# Altium integrated library Altium_WCAP-FTX2 (rev22a).IntLib: 106 symbols (part 1 of 2)
Pins are listed as number, name and electrical type; pins without a type are passive.

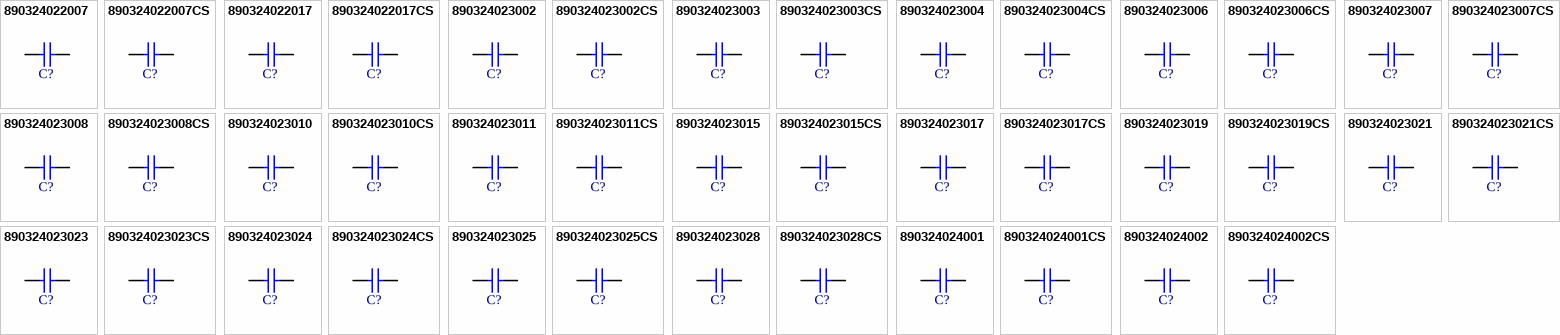
[diagram p0: symbols 890324022007 to 890324024002CS]

## 890324022007
designator C?, comment 15nF  (value not drawn)
WCAP-FTX2 Film Capacitor, THT, L11W6H10mm, 15nF, 275VAC; Manufacturer: Wurth Elektronik; Manufacturer Part Number: 890324022007; Capacitance Tolerance: +/-10%; Dissipation Factor @1kHz: 0.1%; Dissipation Factor @100kHz: 0.5%; Insulation Resistance: 30000MOhm; Pitch: 7.5mm; Rate of Voltage Rise: 500V/us; Rated Voltage (AC): 275V; Technical Reference: MX2P075153K275ASPB15000; ComponentLink1Description: Manufacturer Link; ComponentLink1URL: https://www.we-online.com/redexpert/article/890324022007?ad; ComponentLink2Description: Datasheet; ComponentLink2URL: https://www.we-online.com/redexpert/spec/890324022007?ad; Category: Film Capacitors; Match Code: WCAP-FTX2; Mount: Through Hole; Operating Temperature Max: 105°C; Operating Temperature Min: -40°C; Packaging: Carton; Length: 11mm; Width: 6mm; Height: 10mm; Capacitance: 15nF; Dissipation Factor @10kHz: 0.1%
footprint WCAP-FTX2_L11W6H10
pins: 1, 2

## 890324022007CS
designator C?, comment 15nF  (value not drawn)
WCAP-FTX2 Film Capacitor, THT, L11W6H10mm, 15nF, 275VAC; Manufacturer: Wurth Elektronik; Manufacturer Part Number: 890324022007CS; Capacitance Tolerance: +/-10%; Dissipation Factor @1kHz: 0.1%; Dissipation Factor @100kHz: 0.5%; Insulation Resistance: 30000MOhm; Pitch: 7.5mm; Rate of Voltage Rise: 500V/us; Rated Voltage (AC): 275V; Technical Reference: MX2P075153K275ACPP55004; ComponentLink1Description: Manufacturer Link; ComponentLink1URL: https://www.we-online.com/redexpert/article/890324022007CS?ad; ComponentLink2Description: Datasheet; ComponentLink2URL: https://www.we-online.com/redexpert/spec/890324022007CS?ad; Category: Film Capacitors; Match Code: WCAP-FTX2; Mount: Through Hole; Operating Temperature Max: 105°C; Operating Temperature Min: -40°C; Packaging: Carton; Length: 11mm; Width: 6mm; Height: 10mm; Capacitance: 15nF; Dissipation Factor @10kHz: 0.1%
footprint WCAP-FTX2_L11W6H10_CS
pins: 1, 2

## 890324022017
designator C?, comment 68nF  (value not drawn)
WCAP-FTX2 Film Capacitor, THT, L10W6H12mm, 68nF, 275VAC; Manufacturer: Wurth Elektronik; Manufacturer Part Number: 890324022017; Capacitance Tolerance: +/-10%; Dissipation Factor @1kHz: 0.1%; Dissipation Factor @100kHz: 0.5%; Insulation Resistance: 30000MOhm; Pitch: 7.5mm; Rate of Voltage Rise: 400V/us; Rated Voltage (AC): 275V; Technical Reference: MX2P075683K275ASPB15000; ComponentLink1Description: Manufacturer Link; ComponentLink1URL: https://www.we-online.com/redexpert/article/890324022017?ad; ComponentLink2Description: Datasheet; ComponentLink2URL: https://www.we-online.com/redexpert/spec/890324022017?ad; Category: Film Capacitors; Match Code: WCAP-FTX2; Mount: Through Hole; Operating Temperature Max: 105°C; Operating Temperature Min: -40°C; Packaging: Carton; Length: 10mm; Width: 6mm; Height: 12mm; Capacitance: 68nF; Dissipation Factor @10kHz: 0.1%
footprint WCAP-FTX2_L10W6H12
pins: 1, 2

## 890324022017CS
designator C?, comment 68nF  (value not drawn)
WCAP-FTX2 Film Capacitor, THT, L10W6H12mm, 68nF, 275VAC; Manufacturer: Wurth Elektronik; Manufacturer Part Number: 890324022017CS; Capacitance Tolerance: +/-10%; Dissipation Factor @1kHz: 0.1%; Dissipation Factor @100kHz: 0.5%; Insulation Resistance: 30000MOhm; Pitch: 7.5mm; Rate of Voltage Rise: 400V/us; Rated Voltage (AC): 275V; Technical Reference: MX2P075683K275ACPP45004; ComponentLink1Description: Manufacturer Link; ComponentLink1URL: https://www.we-online.com/redexpert/article/890324022017CS?ad; ComponentLink2Description: Datasheet; ComponentLink2URL: https://www.we-online.com/redexpert/spec/890324022017CS?ad; Category: Film Capacitors; Match Code: WCAP-FTX2; Mount: Through Hole; Operating Temperature Max: 105°C; Operating Temperature Min: -40°C; Packaging: Carton; Length: 10mm; Width: 6mm; Height: 12mm; Capacitance: 68nF; Dissipation Factor @10kHz: 0.1%
footprint WCAP-FTX2_L10W6H12_CS
pins: 1, 2

## 890324023002
designator C?, comment 5.6nF  (value not drawn)
WCAP-FTX2 Film Capacitor, THT, L13W5H10mm, 5.6nF, 275VAC; Manufacturer: Wurth Elektronik; Manufacturer Part Number: 890324023002; Capacitance Tolerance: +/-10%; Dissipation Factor @1kHz: 0.1%; Dissipation Factor @100kHz: 0.5%; Insulation Resistance: 30000MOhm; Pitch: 10mm; Rate of Voltage Rise: 600V/us; Rated Voltage (AC): 275V; Technical Reference: MX2P010562K275ASPB15000; ComponentLink1Description: Manufacturer Link; ComponentLink1URL: https://www.we-online.com/redexpert/article/890324023002?ad; ComponentLink2Description: Datasheet; ComponentLink2URL: https://www.we-online.com/redexpert/spec/890324023002?ad; Category: Film Capacitors; Match Code: WCAP-FTX2; Mount: Through Hole; Operating Temperature Max: 105°C; Operating Temperature Min: -40°C; Packaging: Carton; Length: 13mm; Width: 5mm; Height: 10mm; Capacitance: 5.6nF; Dissipation Factor @10kHz: 0.1%
footprint WCAP-FTX2_L13W5H10
pins: 1, 2

## 890324023002CS
designator C?, comment 5.6nF  (value not drawn)
WCAP-FTX2 Film Capacitor, THT, L13W5H10mm, 5.6nF, 275VAC; Manufacturer: Wurth Elektronik; Manufacturer Part Number: 890324023002CS; Capacitance Tolerance: +/-10%; Dissipation Factor @1kHz: 0.1%; Dissipation Factor @100kHz: 0.5%; Insulation Resistance: 30000MOhm; Pitch: 10mm; Rate of Voltage Rise: 600V/us; Rated Voltage (AC): 275V; Technical Reference: MX2P010562K275ACPP55004; ComponentLink1Description: Manufacturer Link; ComponentLink1URL: https://www.we-online.com/redexpert/article/890324023002CS?ad; ComponentLink2Description: Datasheet; ComponentLink2URL: https://www.we-online.com/redexpert/spec/890324023002CS?ad; Category: Film Capacitors; Match Code: WCAP-FTX2; Mount: Through Hole; Operating Temperature Max: 105°C; Operating Temperature Min: -40°C; Packaging: Carton; Length: 13mm; Width: 5mm; Height: 10mm; Capacitance: 5.6nF; Dissipation Factor @10kHz: 0.1%
footprint WCAP-FTX2_L13W5H10_CS
pins: 1, 2

## 890324023003
designator C?, comment 6.8nF  (value not drawn)
WCAP-FTX2 Film Capacitor, THT, L13W5H10mm, 6.8nF, 275VAC; Manufacturer: Wurth Elektronik; Manufacturer Part Number: 890324023003; Capacitance Tolerance: +/-10%; Dissipation Factor @1kHz: 0.1%; Dissipation Factor @100kHz: 0.5%; Insulation Resistance: 30000MOhm; Pitch: 10mm; Rate of Voltage Rise: 400V/us; Rated Voltage (AC): 275V; Technical Reference: MX2P010682K275ASPB15000; ComponentLink1Description: Manufacturer Link; ComponentLink1URL: https://www.we-online.com/redexpert/article/890324023003?ad; ComponentLink2Description: Datasheet; ComponentLink2URL: https://www.we-online.com/redexpert/spec/890324023003?ad; Category: Film Capacitors; Match Code: WCAP-FTX2; Mount: Through Hole; Operating Temperature Max: 105°C; Operating Temperature Min: -40°C; Packaging: Carton; Length: 13mm; Width: 5mm; Height: 10mm; Capacitance: 6.8nF; Dissipation Factor @10kHz: 0.1%
footprint WCAP-FTX2_L13W5H10
pins: 1, 2

## 890324023003CS
designator C?, comment 6.8nF  (value not drawn)
WCAP-FTX2 Film Capacitor, THT, L13W5H10mm, 6.8nF, 275VAC; Manufacturer: Wurth Elektronik; Manufacturer Part Number: 890324023003CS; Capacitance Tolerance: +/-10%; Dissipation Factor @1kHz: 0.1%; Dissipation Factor @100kHz: 0.5%; Insulation Resistance: 30000MOhm; Pitch: 10mm; Rate of Voltage Rise: 400V/us; Rated Voltage (AC): 275V; Technical Reference: MX2P010682K275ACPP55004; ComponentLink1Description: Manufacturer Link; ComponentLink1URL: https://www.we-online.com/redexpert/article/890324023003CS?ad; ComponentLink2Description: Datasheet; ComponentLink2URL: https://www.we-online.com/redexpert/spec/890324023003CS?ad; Category: Film Capacitors; Match Code: WCAP-FTX2; Mount: Through Hole; Operating Temperature Max: 105°C; Operating Temperature Min: -40°C; Packaging: Carton; Length: 13mm; Width: 5mm; Height: 10mm; Capacitance: 6.8nF; Dissipation Factor @10kHz: 0.1%
footprint WCAP-FTX2_L13W5H10_CS
pins: 1, 2

## 890324023004
designator C?, comment 8.2nF  (value not drawn)
WCAP-FTX2 Film Capacitor, THT, L13W5H10mm, 8.2nF, 275VAC; Manufacturer: Wurth Elektronik; Manufacturer Part Number: 890324023004; Capacitance Tolerance: +/-10%; Dissipation Factor @1kHz: 0.1%; Dissipation Factor @100kHz: 0.5%; Insulation Resistance: 30000MOhm; Pitch: 10mm; Rate of Voltage Rise: 400V/us; Rated Voltage (AC): 275V; Technical Reference: MX2P010822K275ASPB15000; ComponentLink1Description: Manufacturer Link; ComponentLink1URL: https://www.we-online.com/redexpert/article/890324023004?ad; ComponentLink2Description: Datasheet; ComponentLink2URL: https://www.we-online.com/redexpert/spec/890324023004?ad; Category: Film Capacitors; Match Code: WCAP-FTX2; Mount: Through Hole; Operating Temperature Max: 105°C; Operating Temperature Min: -40°C; Packaging: Carton; Length: 13mm; Width: 5mm; Height: 10mm; Capacitance: 8.2nF; Dissipation Factor @10kHz: 0.1%
footprint WCAP-FTX2_L13W5H10
pins: 1, 2

## 890324023004CS
designator C?, comment 8.2nF  (value not drawn)
WCAP-FTX2 Film Capacitor, THT, L13W5H10mm, 8.2nF, 275VAC; Manufacturer: Wurth Elektronik; Manufacturer Part Number: 890324023004CS; Capacitance Tolerance: +/-10%; Dissipation Factor @1kHz: 0.1%; Dissipation Factor @100kHz: 0.5%; Insulation Resistance: 30000MOhm; Pitch: 10mm; Rate of Voltage Rise: 400V/us; Rated Voltage (AC): 275V; Technical Reference: MX2P010822K275ACPP55004; ComponentLink1Description: Manufacturer Link; ComponentLink1URL: https://www.we-online.com/redexpert/article/890324023004CS?ad; ComponentLink2Description: Datasheet; ComponentLink2URL: https://www.we-online.com/redexpert/spec/890324023004CS?ad; Category: Film Capacitors; Match Code: WCAP-FTX2; Mount: Through Hole; Operating Temperature Max: 105°C; Operating Temperature Min: -40°C; Packaging: Carton; Length: 13mm; Width: 5mm; Height: 10mm; Capacitance: 8.2nF; Dissipation Factor @10kHz: 0.1%
footprint WCAP-FTX2_L13W5H10_CS
pins: 1, 2

## 890324023006
designator C?, comment 10nF  (value not drawn)
WCAP-FTX2 Film Capacitor, THT, L13W5H11mm, 10nF, 275VAC; Manufacturer: Wurth Elektronik; Manufacturer Part Number: 890324023006; Capacitance Tolerance: +/-10%; Dissipation Factor @1kHz: 0.1%; Dissipation Factor @100kHz: 0.5%; Insulation Resistance: 30000MOhm; Pitch: 10mm; Rate of Voltage Rise: 500V/us; Rated Voltage (AC): 275V; Technical Reference: MX2P010103K275ASPB16000; ComponentLink1Description: Manufacturer Link; ComponentLink1URL: https://www.we-online.com/redexpert/article/890324023006?ad; ComponentLink2Description: Datasheet; ComponentLink2URL: https://www.we-online.com/redexpert/spec/890324023006?ad; Category: Film Capacitors; Match Code: WCAP-FTX2; Mount: Through Hole; Operating Temperature Max: 105°C; Operating Temperature Min: -40°C; Packaging: Carton; Length: 13mm; Width: 5mm; Height: 11mm; Capacitance: 10nF; Dissipation Factor @10kHz: 0.1%
footprint WCAP-FTX2_L13W5H11
pins: 1, 2

## 890324023006CS
designator C?, comment 10nF  (value not drawn)
WCAP-FTX2 Film Capacitor, THT, L13W5H11mm, 10nF, 275VAC; Manufacturer: Wurth Elektronik; Manufacturer Part Number: 890324023006CS; Capacitance Tolerance: +/-10%; Dissipation Factor @1kHz: 0.1%; Dissipation Factor @100kHz: 0.5%; Insulation Resistance: 30000MOhm; Pitch: 10mm; Rate of Voltage Rise: 500V/us; Rated Voltage (AC): 275V; Technical Reference: MX2P010103K275ACPP56004; ComponentLink1Description: Manufacturer Link; ComponentLink1URL: https://www.we-online.com/redexpert/article/890324023006CS?ad; ComponentLink2Description: Datasheet; ComponentLink2URL: https://www.we-online.com/redexpert/spec/890324023006CS?ad; Category: Film Capacitors; Match Code: WCAP-FTX2; Mount: Through Hole; Operating Temperature Max: 105°C; Operating Temperature Min: -40°C; Packaging: Carton; Length: 13mm; Width: 5mm; Height: 11mm; Capacitance: 10nF; Dissipation Factor @10kHz: 0.1%
footprint WCAP-FTX2_L13W5H11_CS
pins: 1, 2

## 890324023007
designator C?, comment 12nF  (value not drawn)
WCAP-FTX2 Film Capacitor, THT, L13W5H11mm, 12nF, 275VAC; Manufacturer: Wurth Elektronik; Manufacturer Part Number: 890324023007; Capacitance Tolerance: +/-10%; Dissipation Factor @1kHz: 0.1%; Dissipation Factor @100kHz: 0.5%; Insulation Resistance: 30000MOhm; Pitch: 10mm; Rate of Voltage Rise: 300V/us; Rated Voltage (AC): 275V; Technical Reference: MX2P010123K275ASPB15000; ComponentLink1Description: Manufacturer Link; ComponentLink1URL: https://www.we-online.com/redexpert/article/890324023007?ad; ComponentLink2Description: Datasheet; ComponentLink2URL: https://www.we-online.com/redexpert/spec/890324023007?ad; Category: Film Capacitors; Match Code: WCAP-FTX2; Mount: Through Hole; Operating Temperature Max: 105°C; Operating Temperature Min: -40°C; Packaging: Carton; Length: 13mm; Width: 5mm; Height: 11mm; Capacitance: 12nF; Dissipation Factor @10kHz: 0.1%
footprint WCAP-FTX2_L13W5H11
pins: 1, 2

## 890324023007CS
designator C?, comment 12nF  (value not drawn)
WCAP-FTX2 Film Capacitor, THT, L13W5H11mm, 12nF, 275VAC; Manufacturer: Wurth Elektronik; Manufacturer Part Number: 890324023007CS; Capacitance Tolerance: +/-10%; Dissipation Factor @1kHz: 0.1%; Dissipation Factor @100kHz: 0.5%; Insulation Resistance: 30000MOhm; Pitch: 10mm; Rate of Voltage Rise: 300V/us; Rated Voltage (AC): 275V; Technical Reference: MX2P010123K275ACPP55004; ComponentLink1Description: Manufacturer Link; ComponentLink1URL: https://www.we-online.com/redexpert/article/890324023007CS?ad; ComponentLink2Description: Datasheet; ComponentLink2URL: https://www.we-online.com/redexpert/spec/890324023007CS?ad; Category: Film Capacitors; Match Code: WCAP-FTX2; Mount: Through Hole; Operating Temperature Max: 105°C; Operating Temperature Min: -40°C; Packaging: Carton; Length: 13mm; Width: 5mm; Height: 11mm; Capacitance: 12nF; Dissipation Factor @10kHz: 0.1%
footprint WCAP-FTX2_L13W5H11_CS
pins: 1, 2

## 890324023008
designator C?, comment 15nF  (value not drawn)
WCAP-FTX2 Film Capacitor, THT, L13W4.5H9.5mm, 15nF, 275VAC; Manufacturer: Wurth Elektronik; Manufacturer Part Number: 890324023008; Capacitance Tolerance: +/-10%; Dissipation Factor @1kHz: 0.1%; Dissipation Factor @100kHz: 0.5%; Insulation Resistance: 30000MOhm; Pitch: 10mm; Rate of Voltage Rise: 400V/us; Rated Voltage (AC): 275V; Technical Reference: MX2P010153K275ASPB15000; ComponentLink1Description: Manufacturer Link; ComponentLink1URL: https://www.we-online.com/redexpert/article/890324023008?ad; ComponentLink2Description: Datasheet; ComponentLink2URL: https://www.we-online.com/redexpert/spec/890324023008?ad; Category: Film Capacitors; Match Code: WCAP-FTX2; Mount: Through Hole; Operating Temperature Max: 105°C; Operating Temperature Min: -40°C; Packaging: Carton; Length: 13mm; Width: 4.5mm; Height: 9.5mm; Capacitance: 15nF; Dissipation Factor @10kHz: 0.1%
footprint WCAP-FTX2_L13W4.5H9.5
pins: 1, 2

## 890324023008CS
designator C?, comment 15nF  (value not drawn)
WCAP-FTX2 Film Capacitor, THT, L13W4.5H9.5mm, 15nF, 275VAC; Manufacturer: Wurth Elektronik; Manufacturer Part Number: 890324023008CS; Capacitance Tolerance: +/-10%; Dissipation Factor @1kHz: 0.1%; Dissipation Factor @100kHz: 0.5%; Insulation Resistance: 30000MOhm; Pitch: 10mm; Rate of Voltage Rise: 400V/us; Rated Voltage (AC): 275V; Technical Reference: MX2P010153K275ACPP55004; ComponentLink1Description: Manufacturer Link; ComponentLink1URL: https://www.we-online.com/redexpert/article/890324023008CS?ad; ComponentLink2Description: Datasheet; ComponentLink2URL: https://www.we-online.com/redexpert/spec/890324023008CS?ad; Category: Film Capacitors; Match Code: WCAP-FTX2; Mount: Through Hole; Operating Temperature Max: 105°C; Operating Temperature Min: -40°C; Packaging: Carton; Length: 13mm; Width: 4.5mm; Height: 9.5mm; Capacitance: 15nF; Dissipation Factor @10kHz: 0.1%
footprint WCAP-FTX2_L13W4.5H9.5_CS
pins: 1, 2

## 890324023010
designator C?, comment 18nF  (value not drawn)
WCAP-FTX2 Film Capacitor, THT, L13W5H11mm, 18nF, 275VAC; Manufacturer: Wurth Elektronik; Manufacturer Part Number: 890324023010; Capacitance Tolerance: +/-10%; Dissipation Factor @1kHz: 0.1%; Dissipation Factor @100kHz: 0.5%; Insulation Resistance: 30000MOhm; Pitch: 10mm; Rate of Voltage Rise: 400V/us; Rated Voltage (AC): 275V; Technical Reference: MX2P010183K275ASPB15000; ComponentLink1Description: Manufacturer Link; ComponentLink1URL: https://www.we-online.com/redexpert/article/890324023010?ad; ComponentLink2Description: Datasheet; ComponentLink2URL: https://www.we-online.com/redexpert/spec/890324023010?ad; Category: Film Capacitors; Match Code: WCAP-FTX2; Mount: Through Hole; Operating Temperature Max: 105°C; Operating Temperature Min: -40°C; Packaging: Carton; Length: 13mm; Width: 5mm; Height: 11mm; Capacitance: 18nF; Dissipation Factor @10kHz: 0.1%
footprint WCAP-FTX2_L13W5H11
pins: 1, 2

## 890324023010CS
designator C?, comment 18nF  (value not drawn)
WCAP-FTX2 Film Capacitor, THT, L13W5H11mm, 18nF, 275VAC; Manufacturer: Wurth Elektronik; Manufacturer Part Number: 890324023010CS; Capacitance Tolerance: +/-10%; Dissipation Factor @1kHz: 0.1%; Dissipation Factor @100kHz: 0.5%; Insulation Resistance: 30000MOhm; Pitch: 10mm; Rate of Voltage Rise: 400V/us; Rated Voltage (AC): 275V; Technical Reference: MX2P010183K275ACPP55004; ComponentLink1Description: Manufacturer Link; ComponentLink1URL: https://www.we-online.com/redexpert/article/890324023010CS?ad; ComponentLink2Description: Datasheet; ComponentLink2URL: https://www.we-online.com/redexpert/spec/890324023010CS?ad; Category: Film Capacitors; Match Code: WCAP-FTX2; Mount: Through Hole; Operating Temperature Max: 105°C; Operating Temperature Min: -40°C; Packaging: Carton; Length: 13mm; Width: 5mm; Height: 11mm; Capacitance: 18nF; Dissipation Factor @10kHz: 0.1%
footprint WCAP-FTX2_L13W5H11_CS
pins: 1, 2

## 890324023011
designator C?, comment 22nF  (value not drawn)
WCAP-FTX2 Film Capacitor, THT, L13W4.5H9.5mm, 22nF, 275VAC; Manufacturer: Wurth Elektronik; Manufacturer Part Number: 890324023011; Capacitance Tolerance: +/-10%; Dissipation Factor @1kHz: 0.1%; Dissipation Factor @100kHz: 0.5%; Insulation Resistance: 30000MOhm; Pitch: 10mm; Rate of Voltage Rise: 400V/us; Rated Voltage (AC): 275V; Technical Reference: MX2P010223K275ASPB15000; ComponentLink1Description: Manufacturer Link; ComponentLink1URL: https://www.we-online.com/redexpert/article/890324023011?ad; ComponentLink2Description: Datasheet; ComponentLink2URL: https://www.we-online.com/redexpert/spec/890324023011?ad; Category: Film Capacitors; Match Code: WCAP-FTX2; Mount: Through Hole; Operating Temperature Max: 105°C; Operating Temperature Min: -40°C; Packaging: Carton; Length: 13mm; Width: 4.5mm; Height: 9.5mm; Capacitance: 22nF; Dissipation Factor @10kHz: 0.1%
footprint WCAP-FTX2_L13W4.5H9.5
pins: 1, 2

## 890324023011CS
designator C?, comment 22nF  (value not drawn)
WCAP-FTX2 Film Capacitor, THT, L13W4.5H9.5mm, 22nF, 275VAC; Manufacturer: Wurth Elektronik; Manufacturer Part Number: 890324023011CS; Capacitance Tolerance: +/-10%; Dissipation Factor @1kHz: 0.1%; Dissipation Factor @100kHz: 0.5%; Insulation Resistance: 30000MOhm; Pitch: 10mm; Rate of Voltage Rise: 400V/us; Rated Voltage (AC): 275V; Technical Reference: MX2P010223K275ACPP55004; ComponentLink1Description: Manufacturer Link; ComponentLink1URL: https://www.we-online.com/redexpert/article/890324023011CS?ad; ComponentLink2Description: Datasheet; ComponentLink2URL: https://www.we-online.com/redexpert/spec/890324023011CS?ad; Category: Film Capacitors; Match Code: WCAP-FTX2; Mount: Through Hole; Operating Temperature Max: 105°C; Operating Temperature Min: -40°C; Packaging: Carton; Length: 13mm; Width: 4.5mm; Height: 9.5mm; Capacitance: 22nF; Dissipation Factor @10kHz: 0.1%
footprint WCAP-FTX2_L13W4.5H9.5_CS
pins: 1, 2

## 890324023015
designator C?, comment 47nF  (value not drawn)
WCAP-FTX2 Film Capacitor, THT, L13W4.5H9.5mm, 47nF, 275VAC; Manufacturer: Wurth Elektronik; Manufacturer Part Number: 890324023015; Capacitance Tolerance: +/-10%; Dissipation Factor @1kHz: 0.1%; Dissipation Factor @100kHz: 0.5%; Insulation Resistance: 30000MOhm; Pitch: 10mm; Rate of Voltage Rise: 300V/us; Rated Voltage (AC): 275V; Technical Reference: MX2P010473K275ASPB15000; ComponentLink1Description: Manufacturer Link; ComponentLink1URL: https://www.we-online.com/redexpert/article/890324023015?ad; ComponentLink2Description: Datasheet; ComponentLink2URL: https://www.we-online.com/redexpert/spec/890324023015?ad; Category: Film Capacitors; Match Code: WCAP-FTX2; Mount: Through Hole; Operating Temperature Max: 105°C; Operating Temperature Min: -40°C; Packaging: Carton; Length: 13mm; Width: 4.5mm; Height: 9.5mm; Capacitance: 47nF; Dissipation Factor @10kHz: 0.1%
footprint WCAP-FTX2_L13W4.5H9.5
pins: 1, 2

## 890324023015CS
designator C?, comment 47nF  (value not drawn)
WCAP-FTX2 Film Capacitor, THT, L13W4.5H9.5mm, 47nF, 275VAC; Manufacturer: Wurth Elektronik; Manufacturer Part Number: 890324023015CS; Capacitance Tolerance: +/-10%; Dissipation Factor @1kHz: 0.1%; Dissipation Factor @100kHz: 0.5%; Insulation Resistance: 30000MOhm; Pitch: 10mm; Rate of Voltage Rise: 300V/us; Rated Voltage (AC): 275V; Technical Reference: MX2P010473K275ACPP55004; ComponentLink1Description: Manufacturer Link; ComponentLink1URL: https://www.we-online.com/redexpert/article/890324023015CS?ad; ComponentLink2Description: Datasheet; ComponentLink2URL: https://www.we-online.com/redexpert/spec/890324023015CS?ad; Category: Film Capacitors; Match Code: WCAP-FTX2; Mount: Through Hole; Operating Temperature Max: 105°C; Operating Temperature Min: -40°C; Packaging: Carton; Length: 13mm; Width: 4.5mm; Height: 9.5mm; Capacitance: 47nF; Dissipation Factor @10kHz: 0.1%
footprint WCAP-FTX2_L13W4.5H9.5_CS
pins: 1, 2

## 890324023017
designator C?, comment 56nF  (value not drawn)
WCAP-FTX2 Film Capacitor, THT, L13W5H10mm, 56nF, 275VAC; Manufacturer: Wurth Elektronik; Manufacturer Part Number: 890324023017; Capacitance Tolerance: +/-10%; Dissipation Factor @1kHz: 0.1%; Dissipation Factor @100kHz: 0.5%; Insulation Resistance: 30000MOhm; Pitch: 10mm; Rate of Voltage Rise: 300V/us; Rated Voltage (AC): 275V; Technical Reference: MX2P010563K275ASPB15000; ComponentLink1Description: Manufacturer Link; ComponentLink1URL: https://www.we-online.com/redexpert/article/890324023017?ad; ComponentLink2Description: Datasheet; ComponentLink2URL: https://www.we-online.com/redexpert/spec/890324023017?ad; Category: Film Capacitors; Match Code: WCAP-FTX2; Mount: Through Hole; Operating Temperature Max: 105°C; Operating Temperature Min: -40°C; Packaging: Carton; Length: 13mm; Width: 5mm; Height: 10mm; Capacitance: 56nF; Dissipation Factor @10kHz: 0.1%
footprint WCAP-FTX2_L13W5H10
pins: 1, 2

## 890324023017CS
designator C?, comment 56nF  (value not drawn)
WCAP-FTX2 Film Capacitor, THT, L13W5H10mm, 56nF, 275VAC; Manufacturer: Wurth Elektronik; Manufacturer Part Number: 890324023017CS; Capacitance Tolerance: +/-10%; Dissipation Factor @1kHz: 0.1%; Dissipation Factor @100kHz: 0.5%; Insulation Resistance: 30000MOhm; Pitch: 10mm; Rate of Voltage Rise: 300V/us; Rated Voltage (AC): 275V; Technical Reference: MX2P010563K275ACPP55004; ComponentLink1Description: Manufacturer Link; ComponentLink1URL: https://www.we-online.com/redexpert/article/890324023017CS?ad; ComponentLink2Description: Datasheet; ComponentLink2URL: https://www.we-online.com/redexpert/spec/890324023017CS?ad; Category: Film Capacitors; Match Code: WCAP-FTX2; Mount: Through Hole; Operating Temperature Max: 105°C; Operating Temperature Min: -40°C; Packaging: Carton; Length: 13mm; Width: 5mm; Height: 10mm; Capacitance: 56nF; Dissipation Factor @10kHz: 0.1%
footprint WCAP-FTX2_L13W5H10_CS
pins: 1, 2

## 890324023019
designator C?, comment 68nF  (value not drawn)
WCAP-FTX2 Film Capacitor, THT, L13W7H13mm, 68nF, 275VAC; Manufacturer: Wurth Elektronik; Manufacturer Part Number: 890324023019; Capacitance Tolerance: +/-10%; Dissipation Factor @1kHz: 0.1%; Dissipation Factor @100kHz: 0.5%; Insulation Resistance: 30000MOhm; Pitch: 10mm; Rate of Voltage Rise: 400V/us; Rated Voltage (AC): 275V; Technical Reference: MX2P010683K275ASPB16000; ComponentLink1Description: Manufacturer Link; ComponentLink1URL: https://www.we-online.com/redexpert/article/890324023019?ad; ComponentLink2Description: Datasheet; ComponentLink2URL: https://www.we-online.com/redexpert/spec/890324023019?ad; Category: Film Capacitors; Match Code: WCAP-FTX2; Mount: Through Hole; Operating Temperature Max: 105°C; Operating Temperature Min: -40°C; Packaging: Carton; Length: 13mm; Width: 7mm; Height: 13mm; Capacitance: 68nF; Dissipation Factor @10kHz: 0.1%
footprint WCAP-FTX2_L13W7H13
pins: 1, 2

## 890324023019CS
designator C?, comment 68nF  (value not drawn)
WCAP-FTX2 Film Capacitor, THT, L13W7H13mm, 68nF, 275VAC; Manufacturer: Wurth Elektronik; Manufacturer Part Number: 890324023019CS; Capacitance Tolerance: +/-10%; Dissipation Factor @1kHz: 0.1%; Dissipation Factor @100kHz: 0.5%; Insulation Resistance: 30000MOhm; Pitch: 10mm; Rate of Voltage Rise: 400V/us; Rated Voltage (AC): 275V; Technical Reference: MX2P010683K275ACPP46004; ComponentLink1Description: Manufacturer Link; ComponentLink1URL: https://www.we-online.com/redexpert/article/890324023019CS?ad; ComponentLink2Description: Datasheet; ComponentLink2URL: https://www.we-online.com/redexpert/spec/890324023019CS?ad; Category: Film Capacitors; Match Code: WCAP-FTX2; Mount: Through Hole; Operating Temperature Max: 105°C; Operating Temperature Min: -40°C; Packaging: Carton; Length: 13mm; Width: 7mm; Height: 13mm; Capacitance: 68nF; Dissipation Factor @10kHz: 0.1%
footprint WCAP-FTX2_L13W7H13_CS
pins: 1, 2

## 890324023021
designator C?, comment 82nF  (value not drawn)
WCAP-FTX2 Film Capacitor, THT, L13W7H13mm, 82nF, 275VAC; Manufacturer: Wurth Elektronik; Manufacturer Part Number: 890324023021; Capacitance Tolerance: +/-10%; Dissipation Factor @1kHz: 0.1%; Dissipation Factor @100kHz: 0.5%; Insulation Resistance: 30000MOhm; Pitch: 10mm; Rate of Voltage Rise: 400V/us; Rated Voltage (AC): 275V; Technical Reference: MX2P010823K275ASPB16000; ComponentLink1Description: Manufacturer Link; ComponentLink1URL: https://www.we-online.com/redexpert/article/890324023021?ad; ComponentLink2Description: Datasheet; ComponentLink2URL: https://www.we-online.com/redexpert/spec/890324023021?ad; Category: Film Capacitors; Match Code: WCAP-FTX2; Mount: Through Hole; Operating Temperature Max: 105°C; Operating Temperature Min: -40°C; Packaging: Carton; Length: 13mm; Width: 7mm; Height: 13mm; Capacitance: 82nF; Dissipation Factor @10kHz: 0.1%
footprint WCAP-FTX2_L13W7H13
pins: 1, 2

## 890324023021CS
designator C?, comment 82nF  (value not drawn)
WCAP-FTX2 Film Capacitor, THT, L13W7H13mm, 82nF, 275VAC; Manufacturer: Wurth Elektronik; Manufacturer Part Number: 890324023021CS; Capacitance Tolerance: +/-10%; Dissipation Factor @1kHz: 0.1%; Dissipation Factor @100kHz: 0.5%; Insulation Resistance: 30000MOhm; Pitch: 10mm; Rate of Voltage Rise: 400V/us; Rated Voltage (AC): 275V; Technical Reference: MX2P010823K275ACPP46004; ComponentLink1Description: Manufacturer Link; ComponentLink1URL: https://www.we-online.com/redexpert/article/890324023021CS?ad; ComponentLink2Description: Datasheet; ComponentLink2URL: https://www.we-online.com/redexpert/spec/890324023021CS?ad; Category: Film Capacitors; Match Code: WCAP-FTX2; Mount: Through Hole; Operating Temperature Max: 105°C; Operating Temperature Min: -40°C; Packaging: Carton; Length: 13mm; Width: 7mm; Height: 13mm; Capacitance: 82nF; Dissipation Factor @10kHz: 0.1%
footprint WCAP-FTX2_L13W7H13_CS
pins: 1, 2

## 890324023023
designator C?, comment 100nF  (value not drawn)
WCAP-FTX2 Film Capacitor, THT, L13W7H13mm, 100nF, 275VAC; Manufacturer: Wurth Elektronik; Manufacturer Part Number: 890324023023; Capacitance Tolerance: +/-10%; Dissipation Factor @1kHz: 0.1%; Dissipation Factor @100kHz: 0.5%; Insulation Resistance: 30000MOhm; Pitch: 10mm; Rate of Voltage Rise: 300V/us; Rated Voltage (AC): 275V; Technical Reference: MX2P010104K275ASPB16000; ComponentLink1Description: Manufacturer Link; ComponentLink1URL: https://www.we-online.com/redexpert/article/890324023023?ad; ComponentLink2Description: Datasheet; ComponentLink2URL: https://www.we-online.com/redexpert/spec/890324023023?ad; Category: Film Capacitors; Match Code: WCAP-FTX2; Mount: Through Hole; Operating Temperature Max: 105°C; Operating Temperature Min: -40°C; Packaging: Carton; Length: 13mm; Width: 7mm; Height: 13mm; Capacitance: 100nF; Dissipation Factor @10kHz: 0.1%
footprint WCAP-FTX2_L13W7H13
pins: 1, 2

## 890324023023CS
designator C?, comment 100nF  (value not drawn)
WCAP-FTX2 Film Capacitor, THT, L13W7H13mm, 100nF, 275VAC; Manufacturer: Wurth Elektronik; Manufacturer Part Number: 890324023023CS; Capacitance Tolerance: +/-10%; Dissipation Factor @1kHz: 0.1%; Dissipation Factor @100kHz: 0.5%; Insulation Resistance: 30000MOhm; Pitch: 10mm; Rate of Voltage Rise: 300V/us; Rated Voltage (AC): 275V; Technical Reference: MX2P010104K275ACPP46004; ComponentLink1Description: Manufacturer Link; ComponentLink1URL: https://www.we-online.com/redexpert/article/890324023023CS?ad; ComponentLink2Description: Datasheet; ComponentLink2URL: https://www.we-online.com/redexpert/spec/890324023023CS?ad; Category: Film Capacitors; Match Code: WCAP-FTX2; Mount: Through Hole; Operating Temperature Max: 105°C; Operating Temperature Min: -40°C; Packaging: Carton; Length: 13mm; Width: 7mm; Height: 13mm; Capacitance: 100nF; Dissipation Factor @10kHz: 0.1%
footprint WCAP-FTX2_L13W7H13_CS
pins: 1, 2

## 890324023024
designator C?, comment 120nF  (value not drawn)
WCAP-FTX2 Film Capacitor, THT, L13W7H13mm, 120nF, 275VAC; Manufacturer: Wurth Elektronik; Manufacturer Part Number: 890324023024; Capacitance Tolerance: +/-10%; Dissipation Factor @1kHz: 0.1%; Dissipation Factor @10kHz: 0.2%; Dissipation Factor @100kHz: 2%; Insulation Resistance: 30000MOhm; Pitch: 10mm; Rate of Voltage Rise: 400V/us; Rated Voltage (AC): 275V; Technical Reference: MX2P010124K275ASPB15000; ComponentLink1Description: Manufacturer Link; ComponentLink1URL: https://www.we-online.com/redexpert/article/890324023024?ad; ComponentLink2Description: Datasheet; ComponentLink2URL: https://www.we-online.com/redexpert/spec/890324023024?ad; Category: Film Capacitors; Match Code: WCAP-FTX2; Mount: Through Hole; Operating Temperature Max: 105°C; Operating Temperature Min: -40°C; Packaging: Carton; Length: 13mm; Width: 7mm; Height: 13mm; Capacitance: 120nF
footprint WCAP-FTX2_L13W7H13
pins: 1, 2

## 890324023024CS
designator C?, comment 120nF  (value not drawn)
WCAP-FTX2 Film Capacitor, THT, L13W7H13mm, 120nF, 275VAC; Manufacturer: Wurth Elektronik; Manufacturer Part Number: 890324023024CS; Capacitance Tolerance: +/-10%; Dissipation Factor @1kHz: 0.1%; Dissipation Factor @10kHz: 0.2%; Dissipation Factor @100kHz: 2%; Insulation Resistance: 30000MOhm; Pitch: 10mm; Rate of Voltage Rise: 400V/us; Rated Voltage (AC): 275V; Technical Reference: MX2P010124K275ACPP45004; ComponentLink1Description: Manufacturer Link; ComponentLink1URL: https://www.we-online.com/redexpert/article/890324023024CS?ad; ComponentLink2Description: Datasheet; ComponentLink2URL: https://www.we-online.com/redexpert/spec/890324023024CS?ad; Category: Film Capacitors; Match Code: WCAP-FTX2; Mount: Through Hole; Operating Temperature Max: 105°C; Operating Temperature Min: -40°C; Packaging: Carton; Length: 13mm; Width: 7mm; Height: 13mm; Capacitance: 120nF
footprint WCAP-FTX2_L13W7H13_CS
pins: 1, 2

## 890324023025
designator C?, comment 150nF  (value not drawn)
WCAP-FTX2 Film Capacitor, THT, L13W7H12mm, 150nF, 275VAC; Manufacturer: Wurth Elektronik; Manufacturer Part Number: 890324023025; Capacitance Tolerance: +/-10%; Dissipation Factor @1kHz: 0.1%; Dissipation Factor @10kHz: 0.2%; Dissipation Factor @100kHz: 2%; Insulation Resistance: 30000MOhm; Pitch: 10mm; Rate of Voltage Rise: 300V/us; Rated Voltage (AC): 275V; Technical Reference: MX2P010154K275ASPB15000; ComponentLink1Description: Manufacturer Link; ComponentLink1URL: https://www.we-online.com/redexpert/article/890324023025?ad; ComponentLink2Description: Datasheet; ComponentLink2URL: https://www.we-online.com/redexpert/spec/890324023025?ad; Category: Film Capacitors; Match Code: WCAP-FTX2; Mount: Through Hole; Operating Temperature Max: 105°C; Operating Temperature Min: -40°C; Packaging: Carton; Length: 13mm; Width: 7mm; Height: 12mm; Capacitance: 150nF
footprint WCAP-FTX2_L13W7H12
pins: 1, 2

## 890324023025CS
designator C?, comment 150nF  (value not drawn)
WCAP-FTX2 Film Capacitor, THT, L13W7H12mm, 150nF, 275VAC; Manufacturer: Wurth Elektronik; Manufacturer Part Number: 890324023025CS; Capacitance Tolerance: +/-10%; Dissipation Factor @1kHz: 0.1%; Dissipation Factor @10kHz: 0.2%; Dissipation Factor @100kHz: 2%; Insulation Resistance: 30000MOhm; Pitch: 10mm; Rate of Voltage Rise: 300V/us; Rated Voltage (AC): 275V; Technical Reference: MX2P010154K275ACPP45004; ComponentLink1Description: Manufacturer Link; ComponentLink1URL: https://www.we-online.com/redexpert/article/890324023025CS?ad; ComponentLink2Description: Datasheet; ComponentLink2URL: https://www.we-online.com/redexpert/spec/890324023025CS?ad; Category: Film Capacitors; Match Code: WCAP-FTX2; Mount: Through Hole; Operating Temperature Max: 105°C; Operating Temperature Min: -40°C; Packaging: Carton; Length: 13mm; Width: 7mm; Height: 12mm; Capacitance: 150nF
footprint WCAP-FTX2_L13W7H12_CS
pins: 1, 2

## 890324023028
designator C?, comment 220nF  (value not drawn)
WCAP-FTX2 Film Capacitor, THT, L13W8H14mm, 220nF, 275VAC; Manufacturer: Wurth Elektronik; Manufacturer Part Number: 890324023028; Capacitance Tolerance: +/-10%; Dissipation Factor @1kHz: 0.1%; Dissipation Factor @10kHz: 0.2%; Dissipation Factor @100kHz: 2%; Insulation Resistance: 30000MOhm; Pitch: 10mm; Rate of Voltage Rise: 300V/us; Rated Voltage (AC): 275V; Technical Reference: MX2P010224K275ASPB16000; ComponentLink1Description: Manufacturer Link; ComponentLink1URL: https://www.we-online.com/redexpert/article/890324023028?ad; ComponentLink2Description: Datasheet; ComponentLink2URL: https://www.we-online.com/redexpert/spec/890324023028?ad; Category: Film Capacitors; Match Code: WCAP-FTX2; Mount: Through Hole; Operating Temperature Max: 105°C; Operating Temperature Min: -40°C; Packaging: Carton; Length: 13mm; Width: 8mm; Height: 14mm; Capacitance: 220nF
footprint WCAP-FTX2_L13W8H14
pins: 1, 2

## 890324023028CS
designator C?, comment 220nF  (value not drawn)
WCAP-FTX2 Film Capacitor, THT, L13W8H14mm, 220nF, 275VAC; Manufacturer: Wurth Elektronik; Manufacturer Part Number: 890324023028CS; Capacitance Tolerance: +/-10%; Dissipation Factor @1kHz: 0.1%; Dissipation Factor @10kHz: 0.2%; Dissipation Factor @100kHz: 2%; Insulation Resistance: 30000MOhm; Pitch: 10mm; Rate of Voltage Rise: 300V/us; Rated Voltage (AC): 275V; Technical Reference: MX2P010224K275ACPP46004; ComponentLink1Description: Manufacturer Link; ComponentLink1URL: https://www.we-online.com/redexpert/article/890324023028CS?ad; ComponentLink2Description: Datasheet; ComponentLink2URL: https://www.we-online.com/redexpert/spec/890324023028CS?ad; Category: Film Capacitors; Match Code: WCAP-FTX2; Mount: Through Hole; Operating Temperature Max: 105°C; Operating Temperature Min: -40°C; Packaging: Carton; Length: 13mm; Width: 8mm; Height: 14mm; Capacitance: 220nF
footprint WCAP-FTX2_L13W8H14_CS
pins: 1, 2

## 890324024001
designator C?, comment 150nF  (value not drawn)
WCAP-FTX2 Film Capacitor, THT, L15W6H11.5mm, 150nF, 275VAC; Manufacturer: Wurth Elektronik; Manufacturer Part Number: 890324024001; Capacitance Tolerance: +/-10%; Dissipation Factor @1kHz: 0.1%; Dissipation Factor @10kHz: 0.2%; Dissipation Factor @100kHz: 2%; Insulation Resistance: 30000MOhm; Pitch: 12.5mm; Rate of Voltage Rise: 210V/us; Rated Voltage (AC): 275V; Technical Reference: MX2P125154K275ASPB15000; ComponentLink1Description: Manufacturer Link; ComponentLink1URL: https://www.we-online.com/redexpert/article/890324024001?ad; ComponentLink2Description: Datasheet; ComponentLink2URL: https://www.we-online.com/redexpert/spec/890324024001?ad; Category: Film Capacitors; Match Code: WCAP-FTX2; Mount: Through Hole; Operating Temperature Max: 105°C; Operating Temperature Min: -40°C; Packaging: Carton; Length: 15mm; Width: 6mm; Height: 11.5mm; Capacitance: 150nF
footprint WCAP-FTX2_L15W6H11.5
pins: 1, 2

## 890324024001CS
designator C?, comment 150nF  (value not drawn)
WCAP-FTX2 Film Capacitor, THT, L15W6H11.5mm, 150nF, 275VAC; Manufacturer: Wurth Elektronik; Manufacturer Part Number: 890324024001CS; Capacitance Tolerance: +/-10%; Dissipation Factor @1kHz: 0.1%; Dissipation Factor @10kHz: 0.2%; Dissipation Factor @100kHz: 2%; Insulation Resistance: 30000MOhm; Pitch: 12.5mm; Rate of Voltage Rise: 210V/us; Rated Voltage (AC): 275V; Technical Reference: MX2P125154K275ACPP55004; ComponentLink1Description: Manufacturer Link; ComponentLink1URL: https://www.we-online.com/redexpert/article/890324024001CS?ad; ComponentLink2Description: Datasheet; ComponentLink2URL: https://www.we-online.com/redexpert/spec/890324024001CS?ad; Category: Film Capacitors; Match Code: WCAP-FTX2; Mount: Through Hole; Operating Temperature Max: 105°C; Operating Temperature Min: -40°C; Packaging: Carton; Length: 15mm; Width: 6mm; Height: 11.5mm; Capacitance: 150nF
footprint WCAP-FTX2_L15W6H11.5_CS
pins: 1, 2

## 890324024002
designator C?, comment 220nF  (value not drawn)
WCAP-FTX2 Film Capacitor, THT, L15W7H12.5mm, 220nF, 275VAC; Manufacturer: Wurth Elektronik; Manufacturer Part Number: 890324024002; Capacitance Tolerance: +/-10%; Dissipation Factor @1kHz: 0.1%; Dissipation Factor @10kHz: 0.2%; Dissipation Factor @100kHz: 2%; Insulation Resistance: 30000MOhm; Pitch: 12.5mm; Rate of Voltage Rise: 240V/us; Rated Voltage (AC): 275V; Technical Reference: MX2P125224K275ASPB15000; ComponentLink1Description: Manufacturer Link; ComponentLink1URL: https://www.we-online.com/redexpert/article/890324024002?ad; ComponentLink2Description: Datasheet; ComponentLink2URL: https://www.we-online.com/redexpert/spec/890324024002?ad; Category: Film Capacitors; Match Code: WCAP-FTX2; Mount: Through Hole; Operating Temperature Max: 105°C; Operating Temperature Min: -40°C; Packaging: Carton; Length: 15mm; Width: 7mm; Height: 12.5mm; Capacitance: 220nF
footprint WCAP-FTX2_L15W7H12.5
pins: 1, 2

## 890324024002CS
designator C?, comment 220nF  (value not drawn)
WCAP-FTX2 Film Capacitor, THT, L15W7H12.5mm, 220nF, 275VAC; Manufacturer: Wurth Elektronik; Manufacturer Part Number: 890324024002CS; Capacitance Tolerance: +/-10%; Dissipation Factor @1kHz: 0.1%; Dissipation Factor @10kHz: 0.2%; Dissipation Factor @100kHz: 2%; Insulation Resistance: 30000MOhm; Pitch: 12.5mm; Rate of Voltage Rise: 240V/us; Rated Voltage (AC): 275V; Technical Reference: MX2P125224K275ACPP45004; ComponentLink1Description: Manufacturer Link; ComponentLink1URL: https://www.we-online.com/redexpert/article/890324024002CS?ad; ComponentLink2Description: Datasheet; ComponentLink2URL: https://www.we-online.com/redexpert/spec/890324024002CS?ad; Category: Film Capacitors; Match Code: WCAP-FTX2; Mount: Through Hole; Operating Temperature Max: 105°C; Operating Temperature Min: -40°C; Packaging: Carton; Length: 15mm; Width: 7mm; Height: 12.5mm; Capacitance: 220nF
footprint WCAP-FTX2_L15W7H12.5_CS
pins: 1, 2

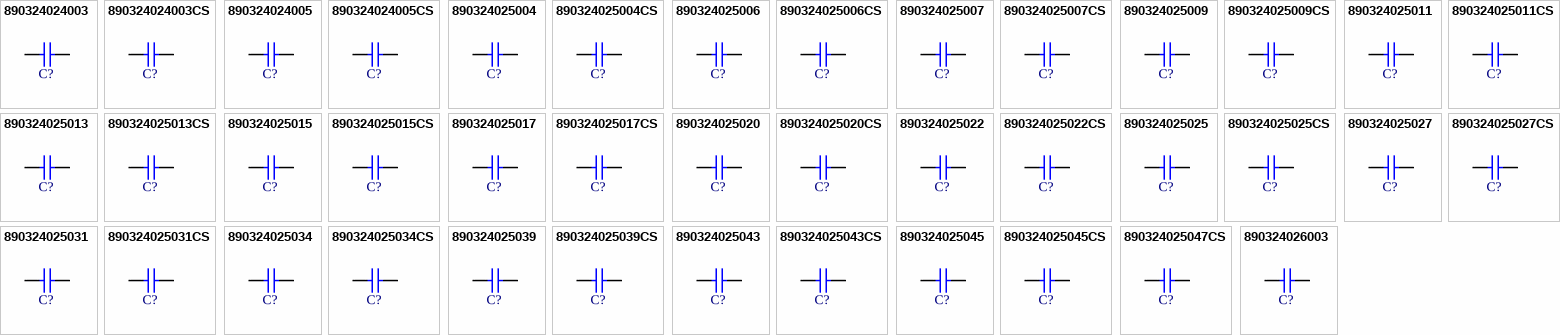
[diagram p1: symbols 890324024003 to 890324026003]

## 890324024003
designator C?, comment 330nF  (value not drawn)
WCAP-FTX2 Film Capacitor, THT, L15W8.5H14mm, 330nF, 275VAC; Manufacturer: Wurth Elektronik; Manufacturer Part Number: 890324024003; Capacitance Tolerance: +/-10%; Dissipation Factor @1kHz: 0.1%; Dissipation Factor @10kHz: 0.2%; Dissipation Factor @100kHz: 2%; Insulation Resistance: 30000MOhm; Pitch: 12.5mm; Rate of Voltage Rise: 260V/us; Rated Voltage (AC): 275V; Technical Reference: MX2P125334K275ASPB15000; ComponentLink1Description: Manufacturer Link; ComponentLink1URL: https://www.we-online.com/redexpert/article/890324024003?ad; ComponentLink2Description: Datasheet; ComponentLink2URL: https://www.we-online.com/redexpert/spec/890324024003?ad; Category: Film Capacitors; Match Code: WCAP-FTX2; Mount: Through Hole; Operating Temperature Max: 105°C; Operating Temperature Min: -40°C; Packaging: Carton; Length: 15mm; Width: 8.5mm; Height: 14mm; Capacitance: 330nF
footprint WCAP-FTX2_L15W8.5H14
pins: 1, 2

## 890324024003CS
designator C?, comment 330nF  (value not drawn)
WCAP-FTX2 Film Capacitor, THT, L15W8.5H14mm, 330nF, 275VAC; Manufacturer: Wurth Elektronik; Manufacturer Part Number: 890324024003CS; Capacitance Tolerance: +/-10%; Dissipation Factor @1kHz: 0.1%; Dissipation Factor @10kHz: 0.2%; Dissipation Factor @100kHz: 2%; Insulation Resistance: 30000MOhm; Pitch: 12.5mm; Rate of Voltage Rise: 260V/us; Rated Voltage (AC): 275V; Technical Reference: MX2P125334K275ACPP45004; ComponentLink1Description: Manufacturer Link; ComponentLink1URL: https://www.we-online.com/redexpert/article/890324024003CS?ad; ComponentLink2Description: Datasheet; ComponentLink2URL: https://www.we-online.com/redexpert/spec/890324024003CS?ad; Category: Film Capacitors; Match Code: WCAP-FTX2; Mount: Through Hole; Operating Temperature Max: 105°C; Operating Temperature Min: -40°C; Packaging: Carton; Length: 15mm; Width: 8.5mm; Height: 14mm; Capacitance: 330nF
footprint WCAP-FTX2_L15W8.5H14_CS
pins: 1, 2

## 890324024005
designator C?, comment 470nF  (value not drawn)
WCAP-FTX2 Film Capacitor, THT, L15W10H16mm, 470nF, 275VAC; Manufacturer: Wurth Elektronik; Manufacturer Part Number: 890324024005; Capacitance Tolerance: +/-10%; Dissipation Factor @1kHz: 0.1%; Dissipation Factor @10kHz: 0.2%; Dissipation Factor @100kHz: 2%; Insulation Resistance: 10000Ohm x F; Pitch: 12.5mm; Rate of Voltage Rise: 280V/us; Rated Voltage (AC): 275V; Technical Reference: MX2P125474K275ASPB15000; ComponentLink1Description: Manufacturer Link; ComponentLink1URL: https://www.we-online.com/redexpert/article/890324024005?ad; ComponentLink2Description: Datasheet; ComponentLink2URL: https://www.we-online.com/redexpert/spec/890324024005?ad; Category: Film Capacitors; Match Code: WCAP-FTX2; Mount: Through Hole; Operating Temperature Max: 105°C; Operating Temperature Min: -40°C; Packaging: Carton; Length: 15mm; Width: 10mm; Height: 16mm; Capacitance: 470nF
footprint WCAP-FTX2_L15W10H16
pins: 1, 2

## 890324024005CS
designator C?, comment 470nF  (value not drawn)
WCAP-FTX2 Film Capacitor, THT, L15W10H16mm, 470nF, 275VAC; Manufacturer: Wurth Elektronik; Manufacturer Part Number: 890324024005CS; Capacitance Tolerance: +/-10%; Dissipation Factor @1kHz: 0.1%; Dissipation Factor @10kHz: 0.2%; Dissipation Factor @100kHz: 2%; Insulation Resistance: 10000Ohm x F; Pitch: 12.5mm; Rate of Voltage Rise: 280V/us; Rated Voltage (AC): 275V; Technical Reference: MX2P125474K275ACPP45004; ComponentLink1Description: Manufacturer Link; ComponentLink1URL: https://www.we-online.com/redexpert/article/890324024005CS?ad; ComponentLink2Description: Datasheet; ComponentLink2URL: https://www.we-online.com/redexpert/spec/890324024005CS?ad; Category: Film Capacitors; Match Code: WCAP-FTX2; Mount: Through Hole; Operating Temperature Max: 105°C; Operating Temperature Min: -40°C; Packaging: Carton; Length: 15mm; Width: 10mm; Height: 16mm; Capacitance: 470nF
footprint WCAP-FTX2_L15W10H16_CS
pins: 1, 2

## 890324025004
designator C?, comment 27nF  (value not drawn)
WCAP-FTX2 Film Capacitor, THT, L18W5H11mm, 27nF, 275VAC; Manufacturer: Wurth Elektronik; Manufacturer Part Number: 890324025004; Capacitance Tolerance: +/-10%; Dissipation Factor @1kHz: 0.1%; Dissipation Factor @100kHz: 0.5%; Insulation Resistance: 30000MOhm; Pitch: 15mm; Rate of Voltage Rise: 300V/us; Rated Voltage (AC): 275V; Technical Reference: MX2P015273K275ASPB15000; ComponentLink1Description: Manufacturer Link; ComponentLink1URL: https://www.we-online.com/redexpert/article/890324025004?ad; ComponentLink2Description: Datasheet; ComponentLink2URL: https://www.we-online.com/redexpert/spec/890324025004?ad; Category: Film Capacitors; Match Code: WCAP-FTX2; Mount: Through Hole; Operating Temperature Max: 105°C; Operating Temperature Min: -40°C; Packaging: Carton; Length: 18mm; Width: 5mm; Height: 11mm; Capacitance: 27nF; Dissipation Factor @10kHz: 0.1%
footprint WCAP-FTX2_L18W5H11
pins: 1, 2

## 890324025004CS
designator C?, comment 27nF  (value not drawn)
WCAP-FTX2 Film Capacitor, THT, L18W5H11mm, 27nF, 275VAC; Manufacturer: Wurth Elektronik; Manufacturer Part Number: 890324025004CS; Capacitance Tolerance: +/-10%; Dissipation Factor @1kHz: 0.1%; Dissipation Factor @100kHz: 0.5%; Insulation Resistance: 30000MOhm; Pitch: 15mm; Rate of Voltage Rise: 300V/us; Rated Voltage (AC): 275V; Technical Reference: MX2P015273K275ACPP45004; ComponentLink1Description: Manufacturer Link; ComponentLink1URL: https://www.we-online.com/redexpert/article/890324025004CS?ad; ComponentLink2Description: Datasheet; ComponentLink2URL: https://www.we-online.com/redexpert/spec/890324025004CS?ad; Category: Film Capacitors; Match Code: WCAP-FTX2; Mount: Through Hole; Operating Temperature Max: 105°C; Operating Temperature Min: -40°C; Packaging: Carton; Length: 18mm; Width: 5mm; Height: 11mm; Capacitance: 27nF; Dissipation Factor @10kHz: 0.1%
footprint WCAP-FTX2_L18W5H11_CS
pins: 1, 2

## 890324025006
designator C?, comment 33nF  (value not drawn)
WCAP-FTX2 Film Capacitor, THT, L18W5H11mm, 33nF, 275VAC; Manufacturer: Wurth Elektronik; Manufacturer Part Number: 890324025006; Capacitance Tolerance: +/-10%; Dissipation Factor @1kHz: 0.1%; Dissipation Factor @100kHz: 0.5%; Insulation Resistance: 30000MOhm; Pitch: 15mm; Rate of Voltage Rise: 300V/us; Rated Voltage (AC): 275V; Technical Reference: MX2P015333K275ASPB16000; ComponentLink1Description: Manufacturer Link; ComponentLink1URL: https://www.we-online.com/redexpert/article/890324025006?ad; ComponentLink2Description: Datasheet; ComponentLink2URL: https://www.we-online.com/redexpert/spec/890324025006?ad; Category: Film Capacitors; Match Code: WCAP-FTX2; Mount: Through Hole; Operating Temperature Max: 105°C; Operating Temperature Min: -40°C; Packaging: Carton; Length: 18mm; Width: 5mm; Height: 11mm; Capacitance: 33nF; Dissipation Factor @10kHz: 0.1%
footprint WCAP-FTX2_L18W5H11
pins: 1, 2

## 890324025006CS
designator C?, comment 33nF  (value not drawn)
WCAP-FTX2 Film Capacitor, THT, L18W5H11mm, 33nF, 275VAC; Manufacturer: Wurth Elektronik; Manufacturer Part Number: 890324025006CS; Capacitance Tolerance: +/-10%; Dissipation Factor @1kHz: 0.1%; Dissipation Factor @100kHz: 0.5%; Insulation Resistance: 30000MOhm; Pitch: 15mm; Rate of Voltage Rise: 300V/us; Rated Voltage (AC): 275V; Technical Reference: MX2P015333K275ACPP46004; ComponentLink1Description: Manufacturer Link; ComponentLink1URL: https://www.we-online.com/redexpert/article/890324025006CS?ad; ComponentLink2Description: Datasheet; ComponentLink2URL: https://www.we-online.com/redexpert/spec/890324025006CS?ad; Category: Film Capacitors; Match Code: WCAP-FTX2; Mount: Through Hole; Operating Temperature Max: 105°C; Operating Temperature Min: -40°C; Packaging: Carton; Length: 18mm; Width: 5mm; Height: 11mm; Capacitance: 33nF; Dissipation Factor @10kHz: 0.1%
footprint WCAP-FTX2_L18W5H11_CS
pins: 1, 2
